# Altium integrated library CustomDevices_OKP.IntLib: 123 symbols
Pins are listed as number, name and electrical type; pins without a type are passive.

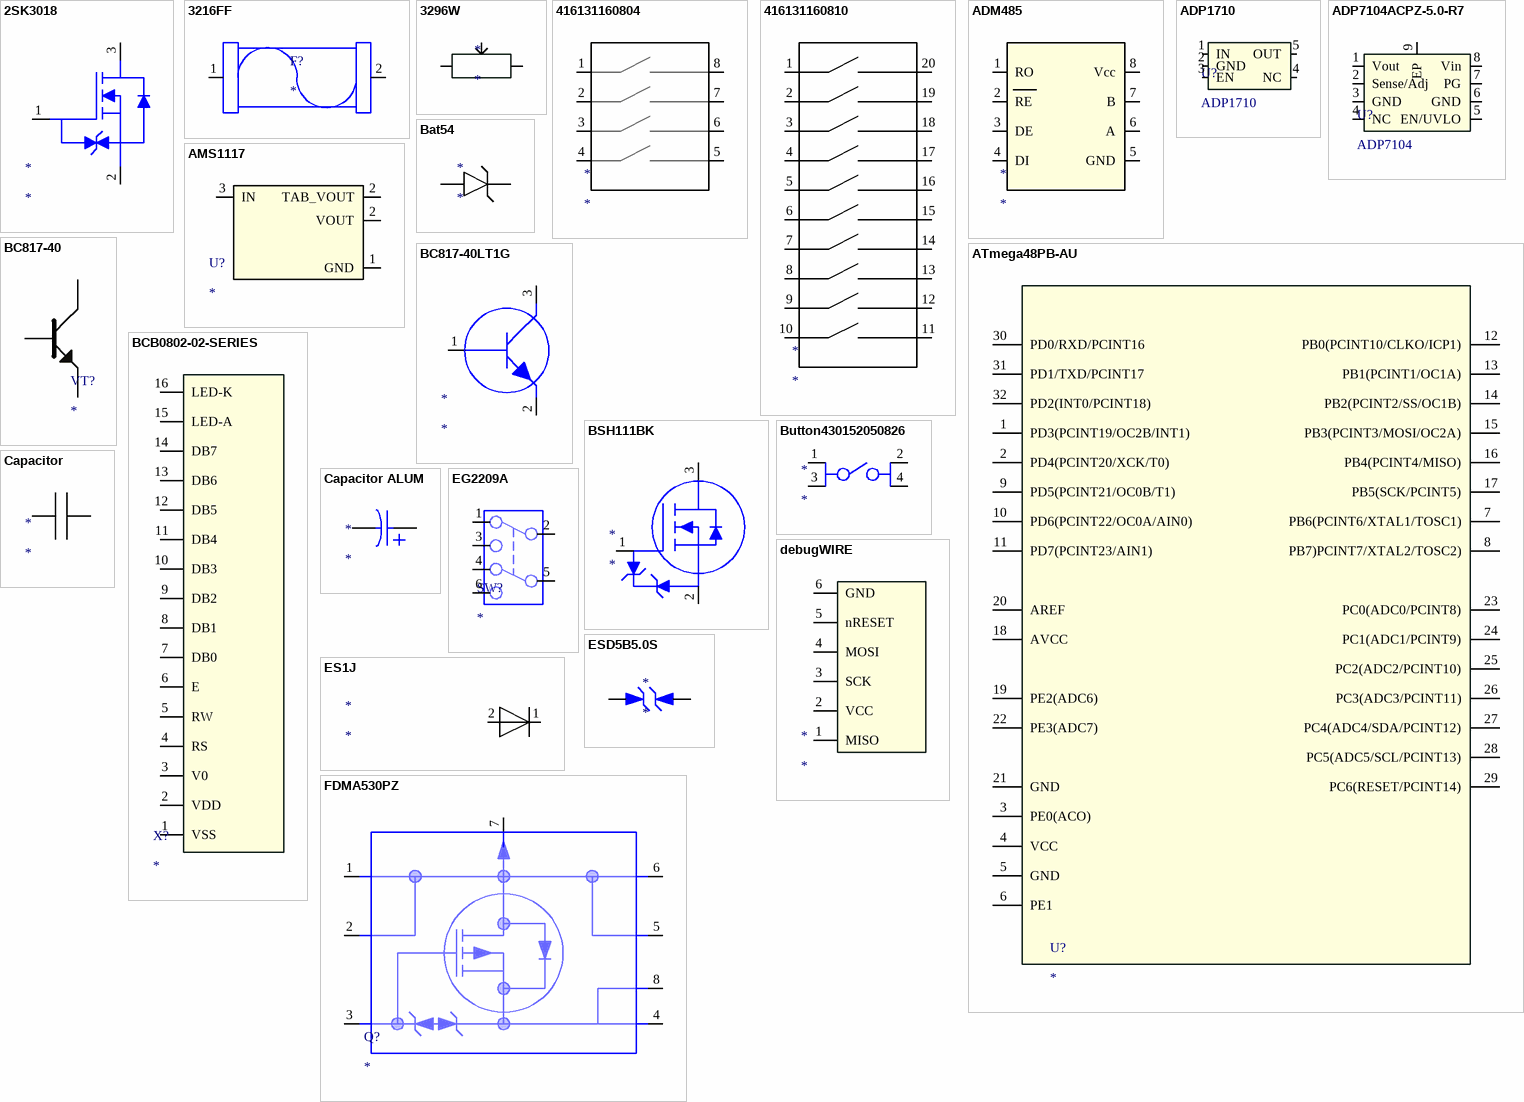
[diagram p0: symbols 2SK3018 to FDMA530PZ]

## 2SK3018
designator *
footprint SOT323 (SOT323, 3-Leads, Body 2,00x2,10mm, Pitch 0,65mm, IPC Medium Density)
pins: 1, 2, 3

## 3216FF
designator F?
footprint 3216FF5-R
pins: 1, 2

## 3296W
designator *
footprint 3296W
pins: 1 a, 2 a, 3 a

## 416131160804
designator *
footprint 416131160804
pins: 1, 2, 3, 4, 5, 6, 7, 8

## 416131160810
designator *
footprint 416131160810
pins: 1, 2, 3, 4, 5, 6, 7, 8, 9, 10, 11, 12, 13, 14, 15, 16, 17, 18, 19, 20

## ADM485
designator *
footprint SO-8
pins: 1 RO, 2 RE, 3 DE, 4 DI, 5 GND, 6 A, 7 B, 8 Vcc

## ADP1710
designator U?
CMOS Linear Regulator
footprint TSOT-5
pins: 1 IN, 2 GND, 3 EN, 4 NC, 5 OUT

## ADP7104ACPZ-5.0-R7
designator U?, comment ADP7104
footprint 8-Lead LFCSP_WD (SON, 8-Leads, Body 3x3mm, Pitch 0.5mm, Thermal Pad 1.74x2.38mm)
pins: 1 Vout, 2 Sense/Adj, 3 GND, 4 NC, 5 EN/UVLO, 6 GND, 7 PG, 8 Vin, 9 EP

## AMS1117
designator U?
footprint SOT223
pins: 1 GND, 2 VOUT, 2 TAB_VOUT, 3 IN

## ATmega48PB-AU
designator U?
footprint TQFP32 (Thin QFP, 32-Leads, Body 7x7mm, Pitch 0.8mm, IPC Low Density)
pins: 1 PD3(PCINT19/OC2B/INT1) "(PCINT19/OC2B/INT1)PD3", 2 PD4(PCINT20/XCK/T0), 3 PE0(ACO), 4 VCC, 5 GND, 6 PE1, 7 PB6(PCINT6/XTAL1/TOSC1), 8 PB7)PCINT7/XTAL2/TOSC2), 9 PD5(PCINT21/OC0B/T1), 10 PD6(PCINT22/OC0A/AIN0), 11 PD7(PCINT23/AIN1), 12 PB0(PCINT10/CLKO/ICP1), 13 PB1(PCINT1/OC1A), 14 PB2(PCINT2/SS/OC1B), 15 PB3(PCINT3/MOSI/OC2A), 16 PB4(PCINT4/MISO), 17 PB5(SCK/PCINT5), 18 AVCC, 19 PE2(ADC6), 20 AREF, 21 GND, 22 PE3(ADC7), 23 PC0(ADC0/PCINT8), 24 PC1(ADC1/PCINT9), 25 PC2(ADC2/PCINT10), 26 PC3(ADC3/PCINT11), 27 PC4(ADC4/SDA/PCINT12), 28 PC5(ADC5/SCL/PCINT13), 29 PC6(RESET/PCINT14), 30 PD0/RXD/PCINT16, 31 PD1/TXD/PCINT17, 32 PD2(INT0/PCINT18)

## Bat54
designator *
footprint SOT23-3 (SOT23, 3 pin)
pins: 1 3, 3 4

## BC817-40
designator VT?
footprint SOT23-3 (SOT23, 3 pin)
pins: 1 BASE, 2 Emitter, 3 Collector

## BC817-40LT1G
designator *
footprint SOT23-3 (SOT23, 3 pin)
pins: 1 BASE, 2 EMITTER, 3 COLLECTOR

## BCB0802-02-SERIES
designator X?
footprint Blaze display
pins: 1 VSS, 2 VDD, 3 V0, 4 RS, 5 RW, 6 E, 7 DB0, 8 DB1, 9 DB2, 10 DB3, 11 DB4, 12 DB5, 13 DB6, 14 DB7, 15 LED-A, 16 LED-K

## BSH111BK
designator *
footprint SOT23-3 (SOT23, 3 pin)
pins: 1, 2, 3

## Button430152050826
designator *
footprint WS-TASV SMT TACT SWITCH
pins: 1, 2, 3, 4

## Capacitor
designator *
footprint Cap0603
footprint Cap1210
footprint Cap0805
footprint Cap1206
footprint T495C686M016ATE250
footprint cap0402
pins: 1, 2

## Capacitor ALUM
designator *
footprint EEE-1EA471UAP
footprint T495C686M016ZTE250
pins: 1, 2

## debugWIRE
designator *
footprint debugWIRE
pins: 1 MISO, 2 VCC, 3 SCK, 4 MOSI, 5 nRESET, 6 GND

## EG2209A
designator SW?
footprint EG 2209
pins: 1, 2, 3, 4, 5, 6

## ES1J
designator *
footprint ES1J
pins: 1 C, 2 A

## ESD5B5.0S
designator *
footprint SOD-523
pins: A 2, C 1

## FDMA530PZ
designator Q?
footprint WDFN6
pins: 1, 2, 3, 4, 5, 6, 7, 8

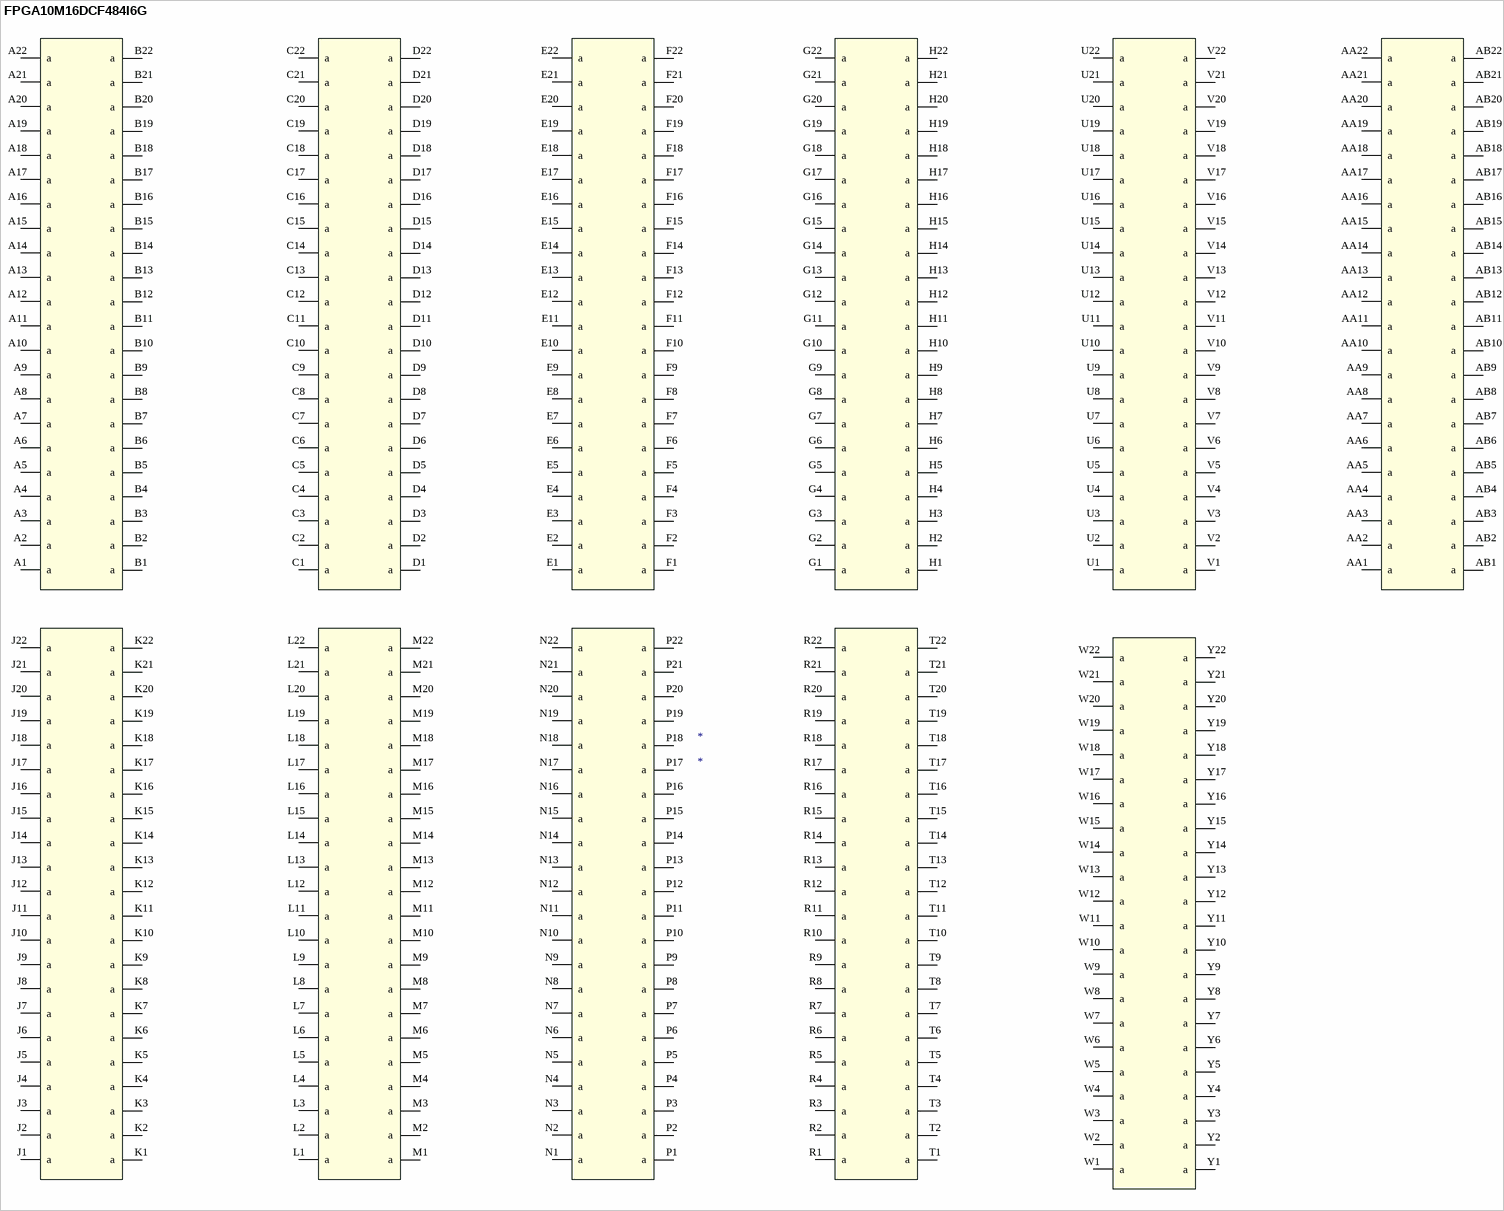
[diagram p1: symbol FPGA10M16DCF484I6G]

## FPGA10M16DCF484I6G
designator *
footprint 484-Pin FBGA
pins: A1 a, A2 a, A3 a, A4 a, A5 a, A6 a, A7 a, A8 a, A9 a, A10 a, A11 a, A12 a, A13 a, A14 a, A15 a, A16 a, A17 a, A18 a, A19 a, A20 a, A21 a, A22 a, AA1 a, AA2 a, AA3 a, AA4 a, AA5 a, AA6 a, AA7 a, AA8 a, AA9 a, AA10 a, AA11 a, AA12 a, AA13 a, AA14 a, AA15 a, AA16 a, AA17 a, AA18 a, AA19 a, AA20 a, AA21 a, AA22 a, AB1 a, AB2 a, AB3 a, AB4 a, AB5 a, AB6 a, AB7 a, AB8 a, AB9 a, AB10 a, AB11 a, AB12 a, AB13 a, AB14 a, AB15 a, AB16 a, AB17 a, AB18 a, AB19 a, AB20 a, AB21 a, AB22 a, B1 a, B2 a, B3 a, B4 a, B5 a, B6 a, B7 a, B8 a, B9 a, B10 a, B11 a, B12 a, B13 a, B14 a, B15 a, B16 a, B17 a, B18 a, B19 a, B20 a, B21 a, B22 a, C1 a, C2 a, C3 a, C4 a, C5 a, C6 a, C7 a, C8 a, C9 a, C10 a, C11 a, C12 a, C13 a, C14 a, C15 a, C16 a, C17 a, C18 a, C19 a, C20 a, C21 a, C22 a, D1 a, D2 a, D3 a, D4 a, D5 a, D6 a, D7 a, D8 a, D9 a, D10 a, D11 a, D12 a, D13 a, D14 a, D15 a, D16 a, D17 a, D18 a, D19 a, D20 a, D21 a, D22 a, E1 a, E2 a, E3 a, E4 a, E5 a, E6 a, E7 a, E8 a, E9 a, E10 a, E11 a, E12 a, E13 a, E14 a, E15 a, E16 a, E17 a, E18 a, E19 a, E20 a, E21 a, E22 a, F1 a, F2 a, F3 a, F4 a, F5 a, F6 a, F7 a, F8 a, F9 a, F10 a, F11 a, F12 a, F13 a, F14 a, F15 a, F16 a, F17 a, F18 a, F19 a, F20 a, F21 a, F22 a, G1 a, G2 a, G3 a, G4 a, G5 a, G6 a, G7 a, G8 a, G9 a, G10 a, G11 a, G12 a, G13 a, G14 a, G15 a, G16 a, G17 a, G18 a, G19 a, G20 a, G21 a, G22 a, H1 a, H2 a, H3 a, H4 a, H5 a, H6 a, H7 a, H8 a, H9 a, H10 a, H11 a, H12 a, H13 a, H14 a, H15 a, H16 a, H17 a, H18 a, H19 a, H20 a, H21 a, H22 a, J1 a, J2 a, J3 a, J4 a, J5 a, J6 a, J7 a, J8 a, J9 a, J10 a, J11 a, J12 a, J13 a, J14 a, J15 a, J16 a, J17 a, J18 a, J19 a, J20 a, J21 a, J22 a, K1 a, K2 a, K3 a, K4 a, K5 a, K6 a, K7 a, K8 a, K9 a, K10 a, K11 a, K12 a, K13 a, K14 a, K15 a, K16 a, K17 a, K18 a, K19 a, K20 a, K21 a, K22 a, L1 a, L2 a, L3 a, L4 a, L5 a, L6 a, L7 a, L8 a, L9 a, L10 a, L11 a, L12 a, L13 a, L14 a, L15 a, L16 a, L17 a, L18 a, L19 a, L20 a, L21 a, L22 a, M1 a, M2 a, M3 a, M4 a, M5 a, M6 a, M7 a, M8 a, M9 a, M10 a, M11 a, M12 a, M13 a, M14 a, M15 a, M16 a, M17 a, M18 a, M19 a, M20 a, M21 a, M22 a, N1 a, N2 a, N3 a, N4 a, N5 a, N6 a, N7 a, N8 a, N9 a, N10 a, N11 a, N12 a, N13 a, N14 a, N15 a, N16 a, N17 a, N18 a, N19 a, N20 a, N21 a, N22 a, P1 a, P2 a, P3 a, P4 a, P5 a, P6 a, P7 a, P8 a, P9 a, P10 a, P11 a, P12 a, P13 a, P14 a, P15 a, P16 a, P17 a, P18 a, P19 a, P20 a, P21 a, P22 a, R1 a, R2 a, R3 a, R4 a, R5 a, R6 a, R7 a, R8 a, R9 a, R10 a, R11 a, R12 a, R13 a, R14 a, R15 a, R16 a, R17 a, R18 a, R19 a, R20 a, R21 a, R22 a, T1 a, T2 a, T3 a, T4 a, T5 a, T6 a, T7 a, T8 a, T9 a, T10 a, T11 a, T12 a, T13 a, T14 a, T15 a, T16 a, T17 a, T18 a, T19 a, T20 a, T21 a, T22 a, U1 a, U2 a, U3 a, U4 a, U5 a, U6 a, U7 a, U8 a, U9 a, U10 a, U11 a, U12 a, U13 a, U14 a, U15 a, U16 a, U17 a, U18 a, U19 a, U20 a, U21 a, U22 a, V1 a, V2 a, V3 a, V4 a, V5 a, V6 a, V7 a, V8 a, V9 a, V10 a, V11 a, V12 a, V13 a, V14 a, V15 a, V16 a, V17 a, V18 a, V19 a, V20 a, V21 a, V22 a, W1 a, W2 a, W3 a, W4 a, W5 a, W6 a, W7 a, W8 a, W9 a, W10 a, W11 a, W12 a, W13 a, W14 a, W15 a, W16 a, W17 a, W18 a, W19 a, W20 a, W21 a, W22 a, Y1 a, Y2 a, Y3 a, Y4 a, Y5 a, Y6 a, Y7 a, Y8 a, Y9 a, Y10 a, Y11 a, Y12 a, Y13 a, Y14 a, Y15 a, Y16 a, Y17 a, Y18 a, Y19 a, Y20 a, Y21 a, Y22 a

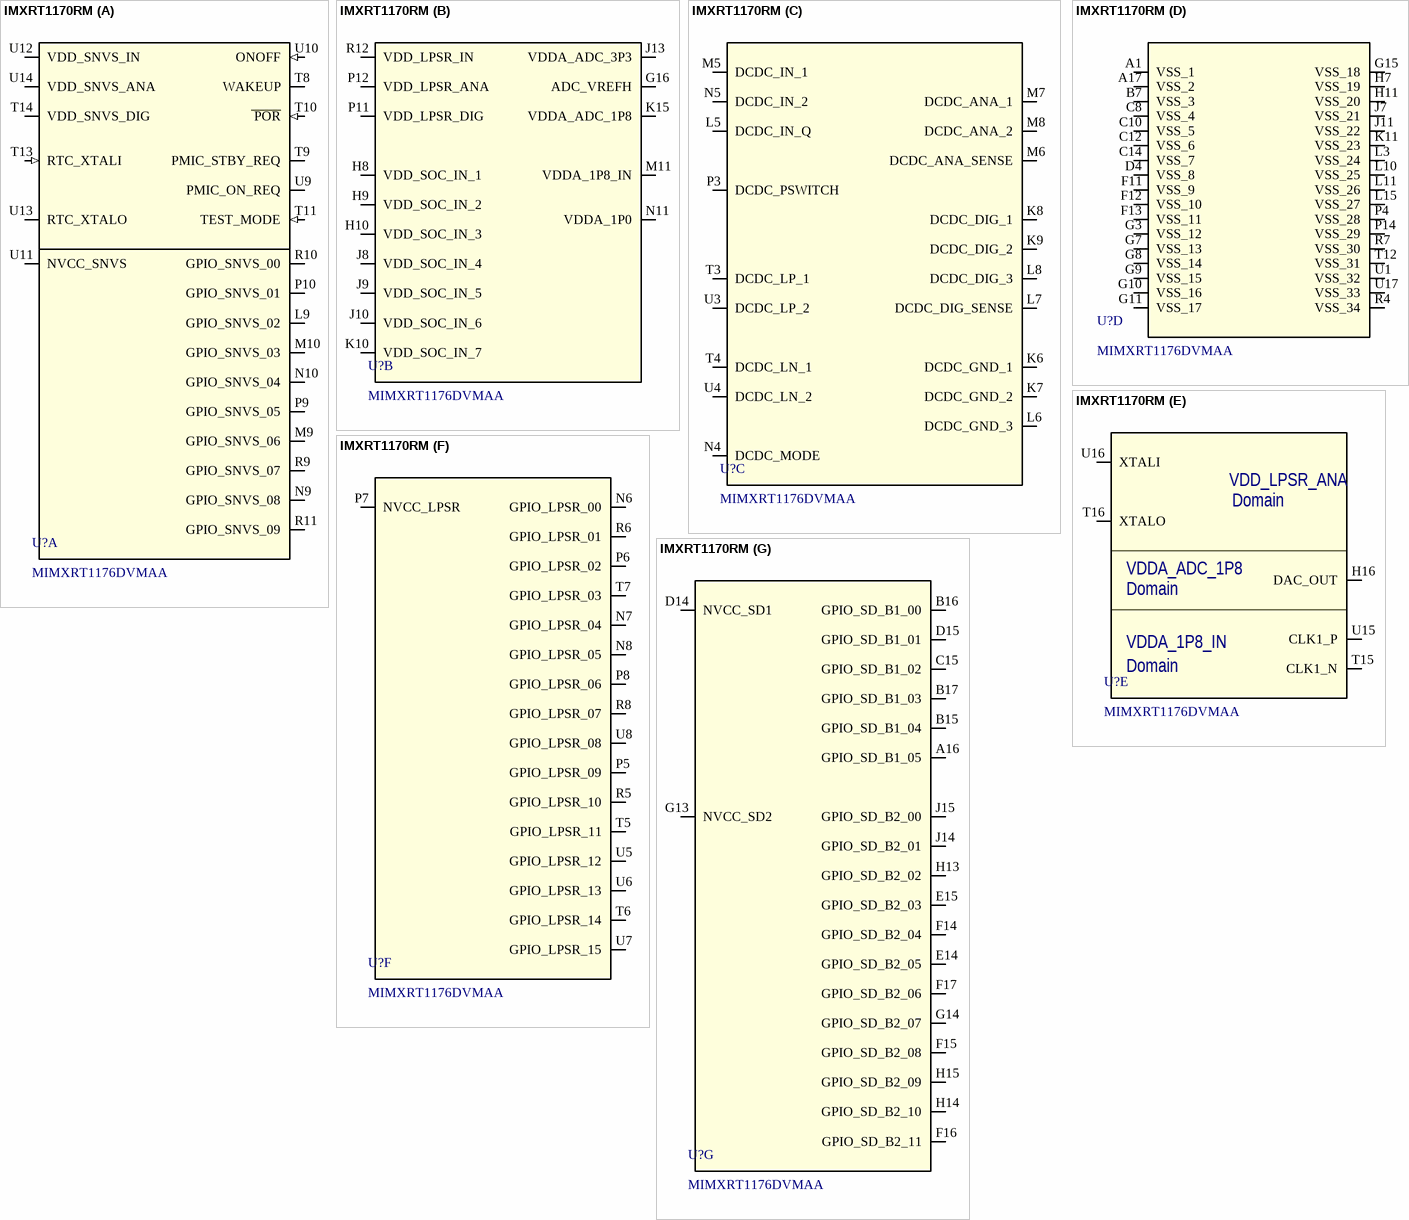
[diagram p2: symbol IMXRT1170RM]

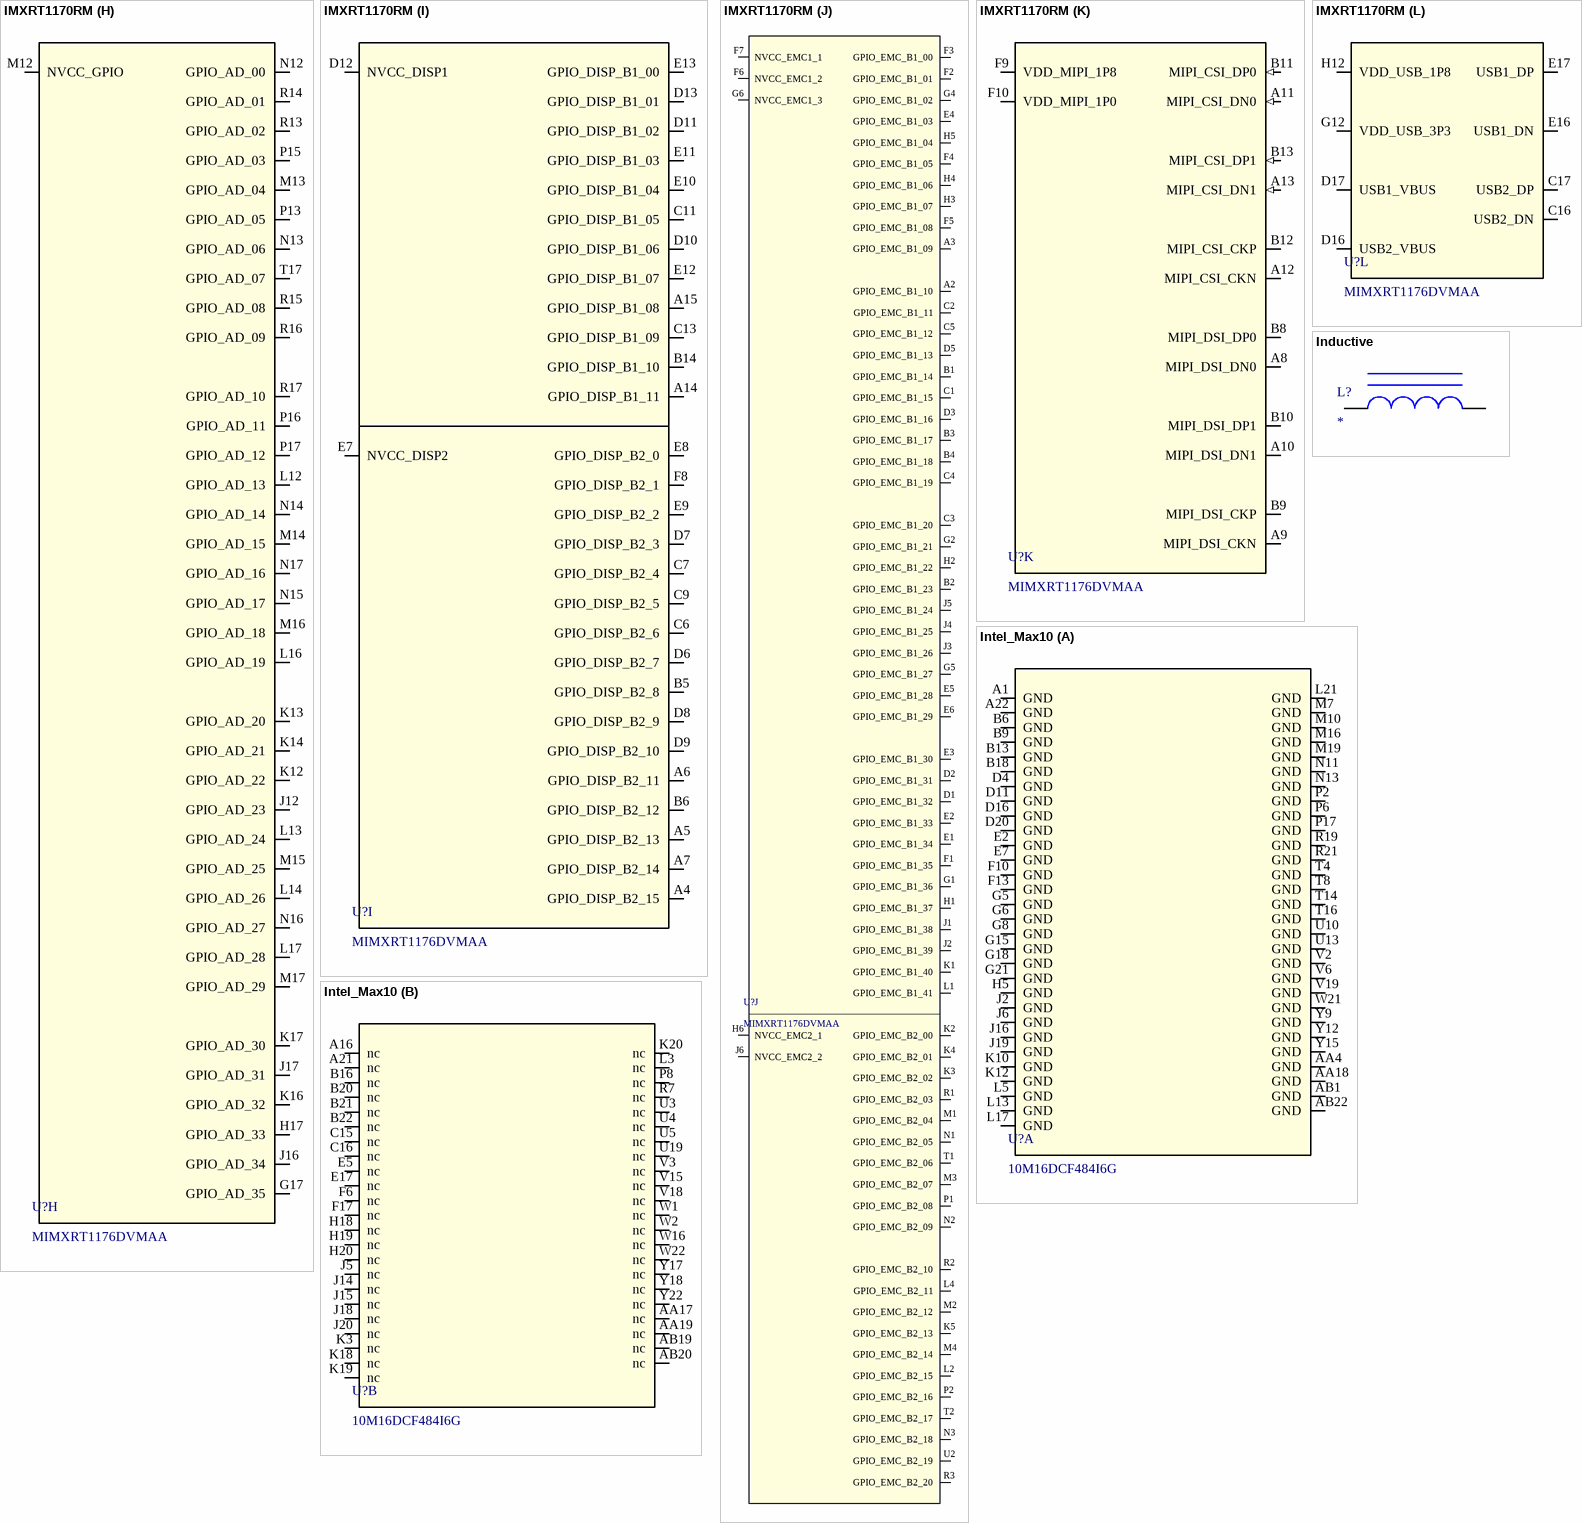
[diagram p3: symbols IMXRT1170RM to Intel_Max10]

## IMXRT1170RM
designator U?, comment MIMXRT1176DVMAA
footprint LFBGA289
part A pins: L9 GPIO_SNVS_02, M9 GPIO_SNVS_06, M10 GPIO_SNVS_03, N9 GPIO_SNVS_08, N10 GPIO_SNVS_04, P9 GPIO_SNVS_05, P10 GPIO_SNVS_01, R9 GPIO_SNVS_07, R10 GPIO_SNVS_00, R11 GPIO_SNVS_09, T8 WAKEUP, T9 PMIC_STBY_REQ, T10 POR (in), T11 TEST_MODE (in), T13 RTC_XTALI (in), T14 VDD_SNVS_DIG, U9 PMIC_ON_REQ, U10 ONOFF (in), U11 NVCC_SNVS, U12 VDD_SNVS_IN, U13 RTC_XTALO, U14 VDD_SNVS_ANA
part B pins: G16 ADC_VREFH, H8 VDD_SOC_IN_1, H9 VDD_SOC_IN_2, H10 VDD_SOC_IN_3, J8 VDD_SOC_IN_4, J9 VDD_SOC_IN_5, J10 VDD_SOC_IN_6, J13 VDDA_ADC_3P3, K10 VDD_SOC_IN_7, K15 VDDA_ADC_1P8, M11 VDDA_1P8_IN, N11 VDDA_1P0, P11 VDD_LPSR_DIG, P12 VDD_LPSR_ANA, R12 VDD_LPSR_IN
part C pins: K6 DCDC_GND_1, K7 DCDC_GND_2, K8 DCDC_DIG_1, K9 DCDC_DIG_2, L5 DCDC_IN_Q, L6 DCDC_GND_3, L7 DCDC_DIG_SENSE, L8 DCDC_DIG_3, M5 DCDC_IN_1, M6 DCDC_ANA_SENSE, M7 DCDC_ANA_1, M8 DCDC_ANA_2, N4 DCDC_MODE, N5 DCDC_IN_2, P3 DCDC_PSWITCH, T3 DCDC_LP_1, T4 DCDC_LN_1, U3 DCDC_LP_2, U4 DCDC_LN_2
part D pins: A1 VSS_1, A17 VSS_2, B7 VSS_3, C8 VSS_4, C10 VSS_5, C12 VSS_6, C14 VSS_7, D4 VSS_8, F11 VSS_9, F12 VSS_10, F13 VSS_11, G3 VSS_12, G7 VSS_13, G8 VSS_14, G9 VSS_15, G10 VSS_16, G11 VSS_17, G15 VSS_18, H7 VSS_19, H11 VSS_20, J7 VSS_21, J11 VSS_22, K11 VSS_23, L3 VSS_24, L10 VSS_25, L11 VSS_26, L15 VSS_27, P4 VSS_28, P14 VSS_29, R4 VSS_34, R7 VSS_30, T12 VSS_31, U1 VSS_32, U17 VSS_33
part E pins: H16 DAC_OUT, T15 CLK1_N, T16 XTALO, U15 CLK1_P, U16 XTALI
part F pins: N6 GPIO_LPSR_00, N7 GPIO_LPSR_04, N8 GPIO_LPSR_05, P5 GPIO_LPSR_09, P6 GPIO_LPSR_02, P7 NVCC_LPSR, P8 GPIO_LPSR_06, R5 GPIO_LPSR_10, R6 GPIO_LPSR_01, R8 GPIO_LPSR_07, T5 GPIO_LPSR_11, T6 GPIO_LPSR_14, T7 GPIO_LPSR_03, U5 GPIO_LPSR_12, U6 GPIO_LPSR_13, U7 GPIO_LPSR_15, U8 GPIO_LPSR_08
part G pins: A16 GPIO_SD_B1_05, B15 GPIO_SD_B1_04, B16 GPIO_SD_B1_00, B17 GPIO_SD_B1_03, C15 GPIO_SD_B1_02, D14 NVCC_SD1, D15 GPIO_SD_B1_01, E14 GPIO_SD_B2_05, E15 GPIO_SD_B2_03, F14 GPIO_SD_B2_04, F15 GPIO_SD_B2_08, F16 GPIO_SD_B2_11, F17 GPIO_SD_B2_06, G13 NVCC_SD2, G14 GPIO_SD_B2_07, H13 GPIO_SD_B2_02, H14 GPIO_SD_B2_10, H15 GPIO_SD_B2_09, J14 GPIO_SD_B2_01, J15 GPIO_SD_B2_00
part H pins: G17 GPIO_AD_35, H17 GPIO_AD_33, J12 GPIO_AD_23, J16 GPIO_AD_34, J17 GPIO_AD_31, K12 GPIO_AD_22, K13 GPIO_AD_20, K14 GPIO_AD_21, K16 GPIO_AD_32, K17 GPIO_AD_30, L12 GPIO_AD_13, L13 GPIO_AD_24, L14 GPIO_AD_26, L16 GPIO_AD_19, L17 GPIO_AD_28, M12 NVCC_GPIO, M13 GPIO_AD_04, M14 GPIO_AD_15, M15 GPIO_AD_25, M16 GPIO_AD_18, M17 GPIO_AD_29, N12 GPIO_AD_00, N13 GPIO_AD_06, N14 GPIO_AD_14, N15 GPIO_AD_17, N16 GPIO_AD_27, N17 GPIO_AD_16, P13 GPIO_AD_05, P15 GPIO_AD_03, P16 GPIO_AD_11, P17 GPIO_AD_12, R13 GPIO_AD_02, R14 GPIO_AD_01, R15 GPIO_AD_08, R16 GPIO_AD_09, R17 GPIO_AD_10, T17 GPIO_AD_07
part I pins: A4 GPIO_DISP_B2_15, A5 GPIO_DISP_B2_13, A6 GPIO_DISP_B2_11, A7 GPIO_DISP_B2_14, A14 GPIO_DISP_B1_11, A15 GPIO_DISP_B1_08, B5 GPIO_DISP_B2_8, B6 GPIO_DISP_B2_12, B14 GPIO_DISP_B1_10, C6 GPIO_DISP_B2_6, C7 GPIO_DISP_B2_4, C9 GPIO_DISP_B2_5, C11 GPIO_DISP_B1_05, C13 GPIO_DISP_B1_09, D6 GPIO_DISP_B2_7, D7 GPIO_DISP_B2_3, D8 GPIO_DISP_B2_9, D9 GPIO_DISP_B2_10, D10 GPIO_DISP_B1_06, D11 GPIO_DISP_B1_02, D12 NVCC_DISP1, D13 GPIO_DISP_B1_01, E7 NVCC_DISP2, E8 GPIO_DISP_B2_0, E9 GPIO_DISP_B2_2, E10 GPIO_DISP_B1_04, E11 GPIO_DISP_B1_03, E12 GPIO_DISP_B1_07, E13 GPIO_DISP_B1_00, F8 GPIO_DISP_B2_1
part J pins: A2 GPIO_EMC_B1_10, A3 GPIO_EMC_B1_09, B1 GPIO_EMC_B1_14, B2 GPIO_EMC_B1_23, B3 GPIO_EMC_B1_17, B4 GPIO_EMC_B1_18, C1 GPIO_EMC_B1_15, C2 GPIO_EMC_B1_11, C3 GPIO_EMC_B1_20, C4 GPIO_EMC_B1_19, C5 GPIO_EMC_B1_12, D1 GPIO_EMC_B1_32, D2 GPIO_EMC_B1_31, D3 GPIO_EMC_B1_16, D5 GPIO_EMC_B1_13, E1 GPIO_EMC_B1_34, E2 GPIO_EMC_B1_33, E3 GPIO_EMC_B1_30, E4 GPIO_EMC_B1_03, E5 GPIO_EMC_B1_28, E6 GPIO_EMC_B1_29, F1 GPIO_EMC_B1_35, F2 GPIO_EMC_B1_01, F3 GPIO_EMC_B1_00, F4 GPIO_EMC_B1_05, F5 GPIO_EMC_B1_08, F6 NVCC_EMC1_2, F7 NVCC_EMC1_1, G1 GPIO_EMC_B1_36, G2 GPIO_EMC_B1_21, G4 GPIO_EMC_B1_02, G5 GPIO_EMC_B1_27, G6 NVCC_EMC1_3, H1 GPIO_EMC_B1_37, H2 GPIO_EMC_B1_22, H3 GPIO_EMC_B1_07, H4 GPIO_EMC_B1_06, H5 GPIO_EMC_B1_04, H6 NVCC_EMC2_1, J1 GPIO_EMC_B1_38, J2 GPIO_EMC_B1_39, J3 GPIO_EMC_B1_26, J4 GPIO_EMC_B1_25, J5 GPIO_EMC_B1_24, J6 NVCC_EMC2_2, K1 GPIO_EMC_B1_40, K2 GPIO_EMC_B2_00, K3 GPIO_EMC_B2_02, K4 GPIO_EMC_B2_01, K5 GPIO_EMC_B2_13, L1 GPIO_EMC_B1_41, L2 GPIO_EMC_B2_15, L4 GPIO_EMC_B2_11, M1 GPIO_EMC_B2_04, M2 GPIO_EMC_B2_12, M3 GPIO_EMC_B2_07, M4 GPIO_EMC_B2_14, N1 GPIO_EMC_B2_05, N2 GPIO_EMC_B2_09, N3 GPIO_EMC_B2_18, P1 GPIO_EMC_B2_08, P2 GPIO_EMC_B2_16, R1 GPIO_EMC_B2_03, R2 GPIO_EMC_B2_10, R3 GPIO_EMC_B2_20, T1 GPIO_EMC_B2_06, T2 GPIO_EMC_B2_17, U2 GPIO_EMC_B2_19
part K pins: A8 MIPI_DSI_DN0, A9 MIPI_DSI_CKN, A10 MIPI_DSI_DN1, A11 MIPI_CSI_DN0 (in), A12 MIPI_CSI_CKN, A13 MIPI_CSI_DN1 (in), B8 MIPI_DSI_DP0, B9 MIPI_DSI_CKP, B10 MIPI_DSI_DP1, B11 MIPI_CSI_DP0 (in), B12 MIPI_CSI_CKP, B13 MIPI_CSI_DP1 (in), F9 VDD_MIPI_1P8, F10 VDD_MIPI_1P0
part L pins: C16 USB2_DN, C17 USB2_DP, D16 USB2_VBUS, D17 USB1_VBUS, E16 USB1_DN, E17 USB1_DP, G12 VDD_USB_3P3, H12 VDD_USB_1P8
part E text: Domain

## Inductive
designator L?
footprint MLZ2012
footprint SPM3012
footprint BLM15AG121SN1D
footprint SWPA4020S1R0NT
pins: 1, 2

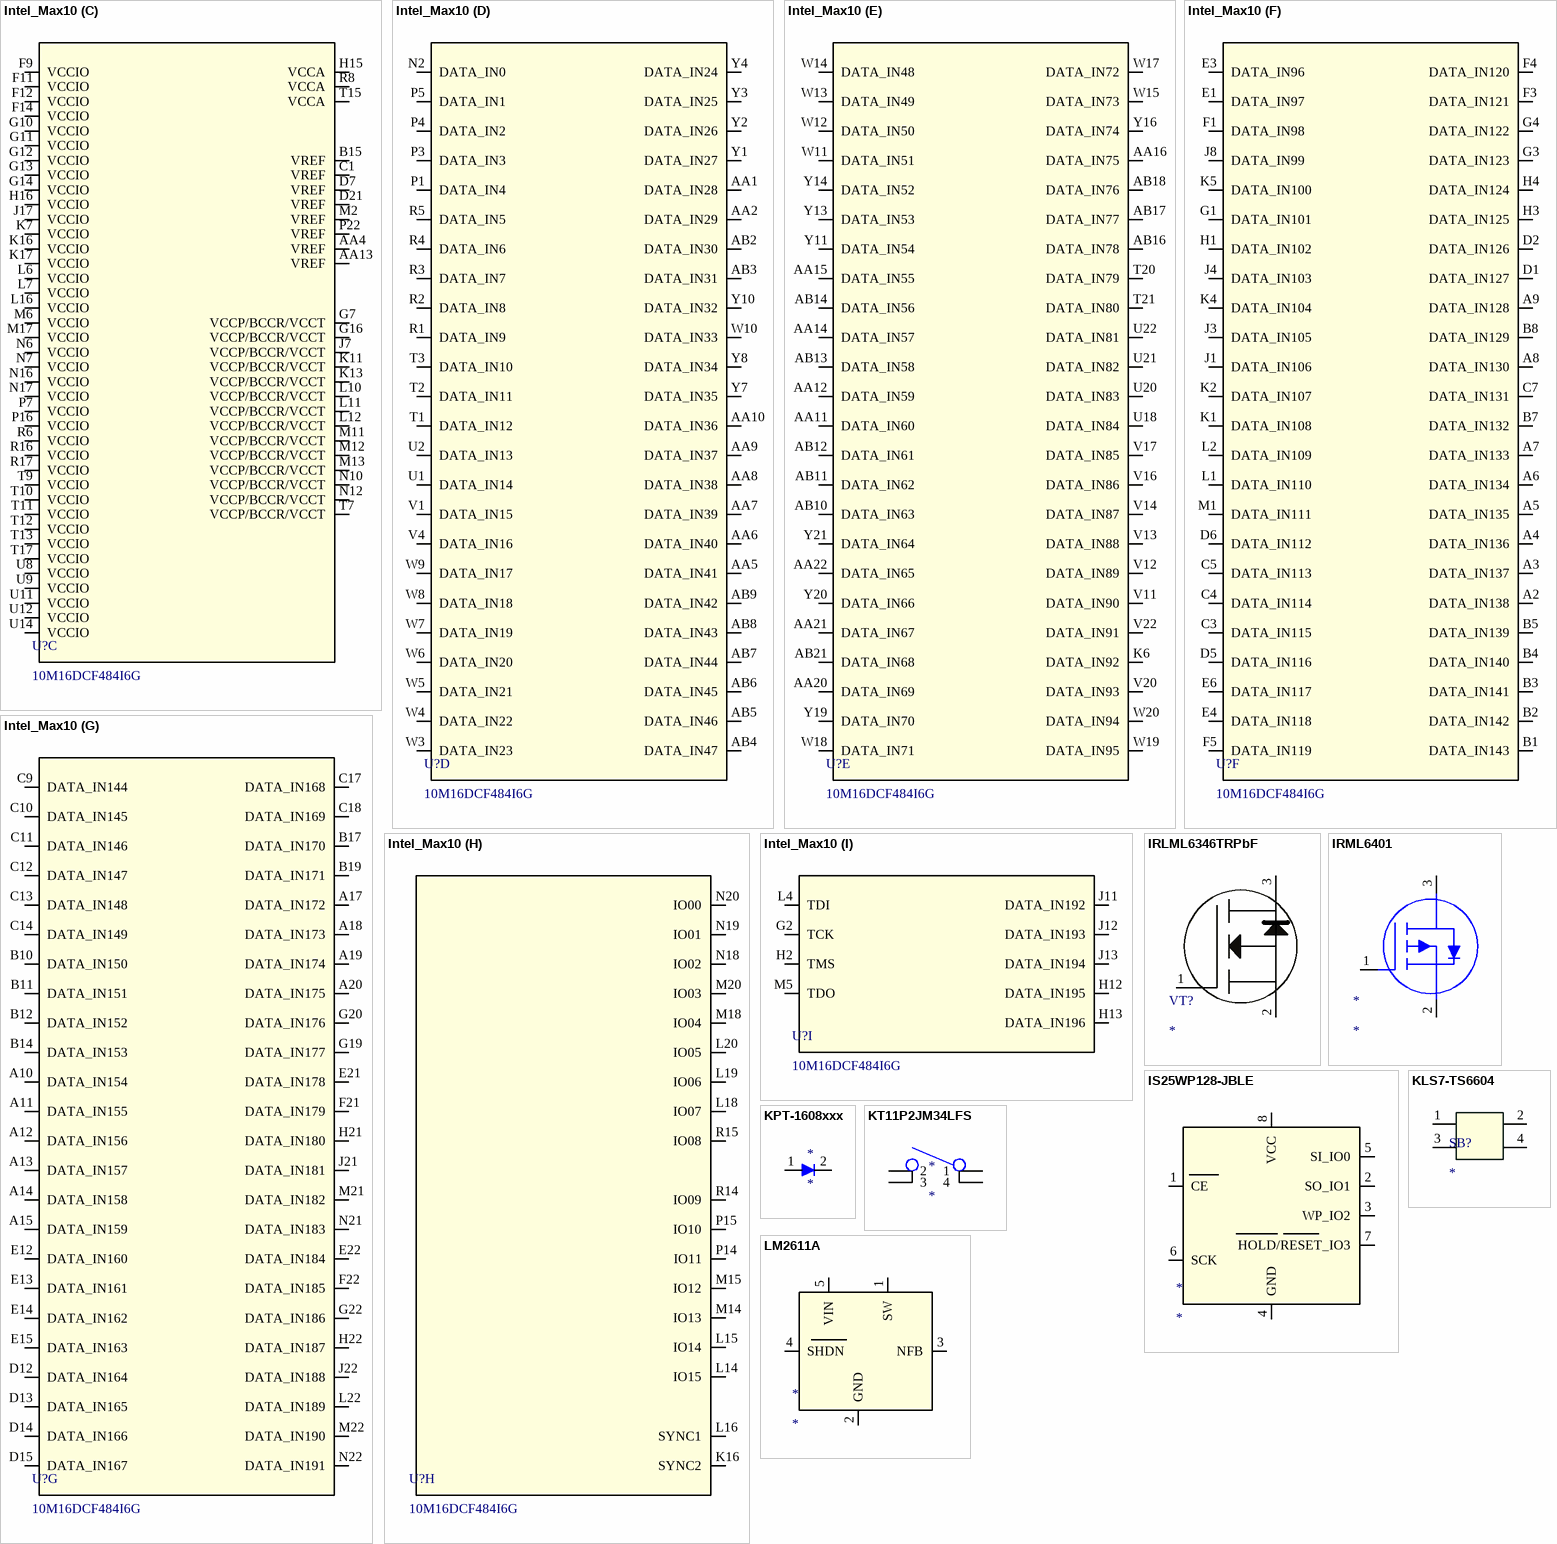
[diagram p4: symbols Intel_Max10 to LM2611A]
